# Altium integrated library Samtec 2 mm Pitch Terminal Strips.IntLib: 623 symbols (part 5 of 5) (continued)
## TW-15-09-T-D-236-SM-A-P (continued)
SMT Board Stacker, Vertical, -55 to 105 degC, 2 mm Pitch, 30-Pin, Male, RoHS; Manufacturer: Samtec; PartNumber: TW-15-09-T-D-236-SM-A-P; Pitch: 2 mm; DatasheetVersion: F-214; PackageVersion: CL, 3/1993; PackageReference: TW-15-09-X-D-236-SM-A-P; PackageDescription: High Temp 2mm SMT Board Stacking Terminal Strip ASM; Orientation: Vertical; RoHS: True; Temperature Range: -55 to 105 degC; Mounting Technology: Surface Mount; ComponentLink1Description: Manufacturer URL; ComponentLink1URL: http://www.samtec.com; ComponentLink2Description: Datasheet; ComponentLink2URL: http://d2a072wq521u33.cloudfront.net/catalog_english//TW_SM.PDF; ComponentLink3Description: Package Specification; ComponentLink3URL: http://www.samtec.com/documents/webfiles/cpdf/TW-XX-XX-XXX-X-XXX-SM-XXX-XX-MKT1.pdf
footprint SMTC-TW-15-09-X-D-236-SM-A-P (SMT Board Stacking Terminal Strip ASM, 2x15 Pins, Vertical, 2mm Pitch, Male)
pins: 1, 2, 3, 4, 5, 6, 7, 8, 9, 10, 11, 12, 13, 14, 15, 16, 17, 18, 19, 20, 21, 22, 23, 24, 25, 26, 27, 28, 29, 30

## TW-15-12-F-D-375-175
designator P?
Through-Hole Board Stacker, Vertical, -55 to 125 degC, 2 mm Pitch, 30-Pin, Male, RoHS; Manufacturer: Samtec; PartNumber: TW-15-12-F-D-375-175; Pitch: 2 mm; DatasheetVersion: F-214; PackageVersion: BF, 6/1998; PackageReference: TW-15-12-X-D-375-175; PackageDescription: High Temp 2mm Terminal Strip(Board Stacking); Orientation: Vertical; RoHS: True; Temperature Range: -55 to 125 degC; Mounting Technology: Through-hole; ComponentLink1Description: Manufacturer URL; ComponentLink1URL: http://www.samtec.com; ComponentLink2Description: Datasheet; ComponentLink2URL: http://d2a072wq521u33.cloudfront.net/catalog_english//TW_TH.PDF; ComponentLink3Description: Package Specification; ComponentLink3URL: http://www.samtec.com/documents/webfiles/cpdf/TW-XX-XX-X-X-XXX-XXX-XXX-XX-MKT2.pdf
footprint SMTC-TW-15-12-X-D-375-175 (Terminal Strip, 2x15 Pins, Vertical, 2mm Pitch, Male)
pins: 1, 2, 3, 4, 5, 6, 7, 8, 9, 10, 11, 12, 13, 14, 15, 16, 17, 18, 19, 20, 21, 22, 23, 24, 25, 26, 27, 28, 29, 30

## TW-15-12-L-D-375-175
designator P?
Through-Hole Board Stacker, Vertical, -55 to 125 degC, 2 mm Pitch, 30-Pin, Male, RoHS; Manufacturer: Samtec; PartNumber: TW-15-12-L-D-375-175; Pitch: 2 mm; DatasheetVersion: F-214; PackageVersion: BF, 6/1998; PackageReference: TW-15-12-X-D-375-175; PackageDescription: High Temp 2mm Terminal Strip(Board Stacking); Orientation: Vertical; RoHS: True; Temperature Range: -55 to 125 degC; Mounting Technology: Through-hole; ComponentLink1Description: Manufacturer URL; ComponentLink1URL: http://www.samtec.com; ComponentLink2Description: Datasheet; ComponentLink2URL: http://d2a072wq521u33.cloudfront.net/catalog_english//TW_TH.PDF; ComponentLink3Description: Package Specification; ComponentLink3URL: http://www.samtec.com/documents/webfiles/cpdf/TW-XX-XX-X-X-XXX-XXX-XXX-XX-MKT2.pdf
footprint SMTC-TW-15-12-X-D-375-175 (Terminal Strip, 2x15 Pins, Vertical, 2mm Pitch, Male)
pins: 1, 2, 3, 4, 5, 6, 7, 8, 9, 10, 11, 12, 13, 14, 15, 16, 17, 18, 19, 20, 21, 22, 23, 24, 25, 26, 27, 28, 29, 30

## TW-15-12-T-D-375-175
designator P?
Through-Hole Board Stacker, Vertical, -55 to 105 degC, 2 mm Pitch, 30-Pin, Male, RoHS; Manufacturer: Samtec; PartNumber: TW-15-12-T-D-375-175; Pitch: 2 mm; DatasheetVersion: F-214; PackageVersion: BF, 6/1998; PackageReference: TW-15-12-X-D-375-175; PackageDescription: High Temp 2mm Terminal Strip(Board Stacking); Orientation: Vertical; RoHS: True; Temperature Range: -55 to 105 degC; Mounting Technology: Through-hole; ComponentLink1Description: Manufacturer URL; ComponentLink1URL: http://www.samtec.com; ComponentLink2Description: Datasheet; ComponentLink2URL: http://d2a072wq521u33.cloudfront.net/catalog_english//TW_TH.PDF; ComponentLink3Description: Package Specification; ComponentLink3URL: http://www.samtec.com/documents/webfiles/cpdf/TW-XX-XX-X-X-XXX-XXX-XXX-XX-MKT2.pdf
footprint SMTC-TW-15-12-X-D-375-175 (Terminal Strip, 2x15 Pins, Vertical, 2mm Pitch, Male)
pins: 1, 2, 3, 4, 5, 6, 7, 8, 9, 10, 11, 12, 13, 14, 15, 16, 17, 18, 19, 20, 21, 22, 23, 24, 25, 26, 27, 28, 29, 30

## TW-16-06-F-D-300-SM-A
designator P?
SMT Board Stacker, Vertical, -55 to 125 degC, 2 mm Pitch, 32-Pin, Male, RoHS; Manufacturer: Samtec; PartNumber: TW-16-06-F-D-300-SM-A; Pitch: 2 mm; DatasheetVersion: F-214; PackageVersion: CL, 3/1993; PackageReference: TW-16-06-X-D-300-SM-A; PackageDescription: High Temp 2mm SMT Board Stacking Terminal Strip ASM; Orientation: Vertical; RoHS: True; Temperature Range: -55 to 125 degC; Mounting Technology: Surface Mount; ComponentLink1Description: Manufacturer URL; ComponentLink1URL: http://www.samtec.com; ComponentLink2Description: Datasheet; ComponentLink2URL: http://d2a072wq521u33.cloudfront.net/catalog_english//TW_SM.PDF; ComponentLink3Description: Package Specification; ComponentLink3URL: http://www.samtec.com/documents/webfiles/cpdf/TW-XX-XX-XXX-X-XXX-SM-XXX-XX-MKT1.pdf
footprint SMTC-TW-16-06-X-D-300-SM-A (SMT Board Stacking Terminal Strip ASM, 2x16 Pins, Vertical, 2mm Pitch, Male)
pins: 1, 2, 3, 4, 5, 6, 7, 8, 9, 10, 11, 12, 13, 14, 15, 16, 17, 18, 19, 20, 21, 22, 23, 24, 25, 26, 27, 28, 29, 30, 31, 32

## TW-16-06-L-D-300-SM-A
designator P?
SMT Board Stacker, Vertical, -55 to 125 degC, 2 mm Pitch, 32-Pin, Male, RoHS; Manufacturer: Samtec; PartNumber: TW-16-06-L-D-300-SM-A; Pitch: 2 mm; DatasheetVersion: F-214; PackageVersion: CL, 3/1993; PackageReference: TW-16-06-X-D-300-SM-A; PackageDescription: High Temp 2mm SMT Board Stacking Terminal Strip ASM; Orientation: Vertical; RoHS: True; Temperature Range: -55 to 125 degC; Mounting Technology: Surface Mount; ComponentLink1Description: Manufacturer URL; ComponentLink1URL: http://www.samtec.com; ComponentLink2Description: Datasheet; ComponentLink2URL: http://d2a072wq521u33.cloudfront.net/catalog_english//TW_SM.PDF; ComponentLink3Description: Package Specification; ComponentLink3URL: http://www.samtec.com/documents/webfiles/cpdf/TW-XX-XX-XXX-X-XXX-SM-XXX-XX-MKT1.pdf
footprint SMTC-TW-16-06-X-D-300-SM-A (SMT Board Stacking Terminal Strip ASM, 2x16 Pins, Vertical, 2mm Pitch, Male)
pins: 1, 2, 3, 4, 5, 6, 7, 8, 9, 10, 11, 12, 13, 14, 15, 16, 17, 18, 19, 20, 21, 22, 23, 24, 25, 26, 27, 28, 29, 30, 31, 32

## TW-16-06-T-D-300-SM-A
designator P?
SMT Board Stacker, Vertical, -55 to 105 degC, 2 mm Pitch, 32-Pin, Male, RoHS; Manufacturer: Samtec; PartNumber: TW-16-06-T-D-300-SM-A; Pitch: 2 mm; DatasheetVersion: F-214; PackageVersion: CL, 3/1993; PackageReference: TW-16-06-X-D-300-SM-A; PackageDescription: High Temp 2mm SMT Board Stacking Terminal Strip ASM; Orientation: Vertical; RoHS: True; Temperature Range: -55 to 105 degC; Mounting Technology: Surface Mount; ComponentLink1Description: Manufacturer URL; ComponentLink1URL: http://www.samtec.com; ComponentLink2Description: Datasheet; ComponentLink2URL: http://d2a072wq521u33.cloudfront.net/catalog_english//TW_SM.PDF; ComponentLink3Description: Package Specification; ComponentLink3URL: http://www.samtec.com/documents/webfiles/cpdf/TW-XX-XX-XXX-X-XXX-SM-XXX-XX-MKT1.pdf
footprint SMTC-TW-16-06-X-D-300-SM-A (SMT Board Stacking Terminal Strip ASM, 2x16 Pins, Vertical, 2mm Pitch, Male)
pins: 1, 2, 3, 4, 5, 6, 7, 8, 9, 10, 11, 12, 13, 14, 15, 16, 17, 18, 19, 20, 21, 22, 23, 24, 25, 26, 27, 28, 29, 30, 31, 32

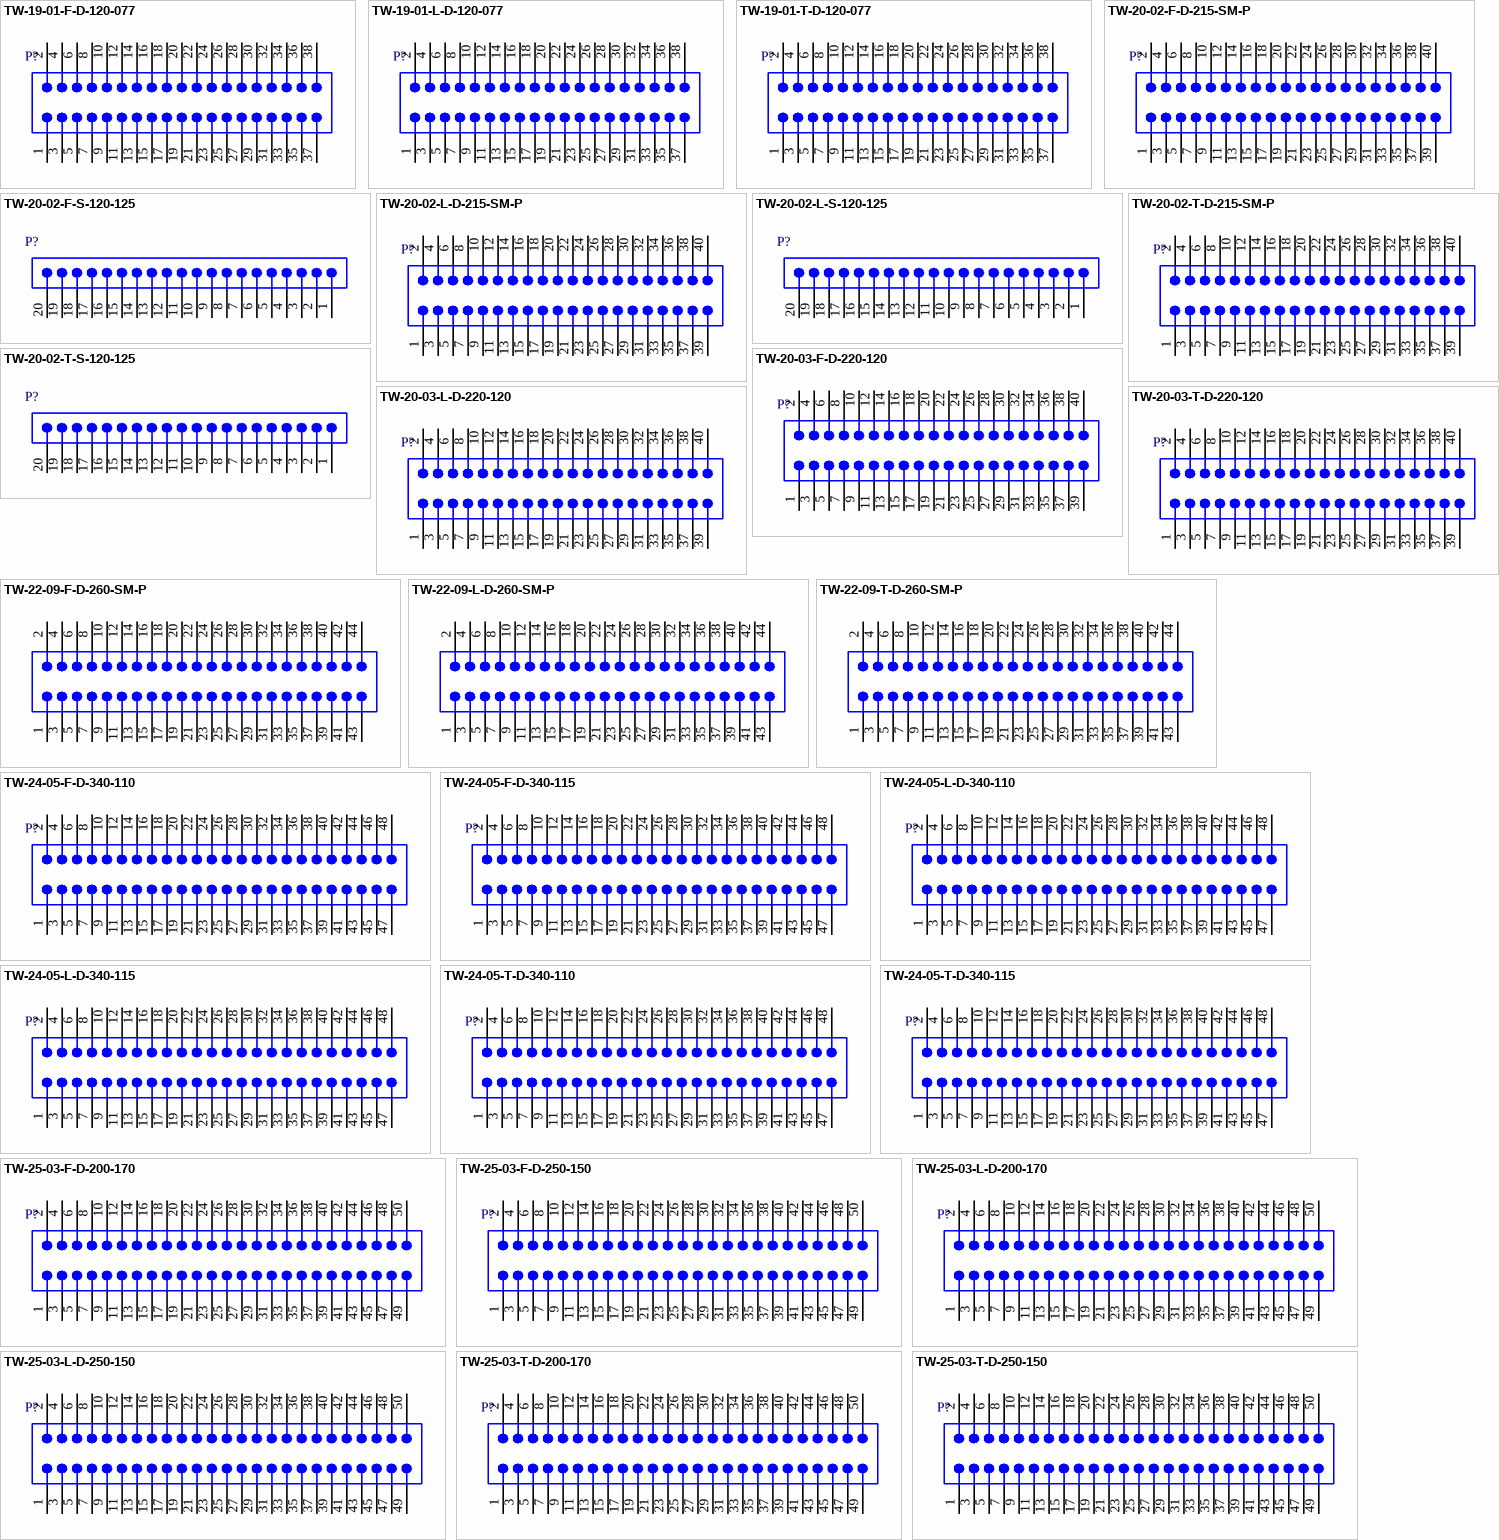
[diagram p15: symbols TW-19-01-F-D-120-077 to TW-25-03-T-D-250-150]

## TW-19-01-F-D-120-077
designator P?
Through-Hole Board Stacker, Vertical, -55 to 125 degC, 2 mm Pitch, 38-Pin, Male, RoHS; Manufacturer: Samtec; PartNumber: TW-19-01-F-D-120-077; Pitch: 2 mm; DatasheetVersion: F-214; PackageVersion: BF, 6/1998; PackageReference: TW-19-01-X-D-120-077; PackageDescription: High Temp 2mm Terminal Strip(Board Stacking); Orientation: Vertical; RoHS: True; Temperature Range: -55 to 125 degC; Mounting Technology: Through-hole; ComponentLink1Description: Manufacturer URL; ComponentLink1URL: http://www.samtec.com; ComponentLink2Description: Datasheet; ComponentLink2URL: http://d2a072wq521u33.cloudfront.net/catalog_english//TW_TH.PDF; ComponentLink3Description: Package Specification; ComponentLink3URL: http://www.samtec.com/documents/webfiles/cpdf/TW-XX-XX-X-X-XXX-XXX-XXX-XX-MKT2.pdf
footprint SMTC-TW-19-01-X-D-120-077 (Terminal Strip, 2x19 Pins, Vertical, 2mm Pitch, Male)
pins: 1, 2, 3, 4, 5, 6, 7, 8, 9, 10, 11, 12, 13, 14, 15, 16, 17, 18, 19, 20, 21, 22, 23, 24, 25, 26, 27, 28, 29, 30, 31, 32, 33, 34, 35, 36, 37, 38

## TW-19-01-L-D-120-077
designator P?
Through-Hole Board Stacker, Vertical, -55 to 125 degC, 2 mm Pitch, 38-Pin, Male, RoHS; Manufacturer: Samtec; PartNumber: TW-19-01-L-D-120-077; Pitch: 2 mm; DatasheetVersion: F-214; PackageVersion: BF, 6/1998; PackageReference: TW-19-01-X-D-120-077; PackageDescription: High Temp 2mm Terminal Strip(Board Stacking); Orientation: Vertical; RoHS: True; Temperature Range: -55 to 125 degC; Mounting Technology: Through-hole; ComponentLink1Description: Manufacturer URL; ComponentLink1URL: http://www.samtec.com; ComponentLink2Description: Datasheet; ComponentLink2URL: http://d2a072wq521u33.cloudfront.net/catalog_english//TW_TH.PDF; ComponentLink3Description: Package Specification; ComponentLink3URL: http://www.samtec.com/documents/webfiles/cpdf/TW-XX-XX-X-X-XXX-XXX-XXX-XX-MKT2.pdf
footprint SMTC-TW-19-01-X-D-120-077 (Terminal Strip, 2x19 Pins, Vertical, 2mm Pitch, Male)
pins: 1, 2, 3, 4, 5, 6, 7, 8, 9, 10, 11, 12, 13, 14, 15, 16, 17, 18, 19, 20, 21, 22, 23, 24, 25, 26, 27, 28, 29, 30, 31, 32, 33, 34, 35, 36, 37, 38

## TW-19-01-T-D-120-077
designator P?
Through-Hole Board Stacker, Vertical, -55 to 105 degC, 2 mm Pitch, 38-Pin, Male, RoHS; Manufacturer: Samtec; PartNumber: TW-19-01-T-D-120-077; Pitch: 2 mm; DatasheetVersion: F-214; PackageVersion: BF, 6/1998; PackageReference: TW-19-01-X-D-120-077; PackageDescription: High Temp 2mm Terminal Strip(Board Stacking); Orientation: Vertical; RoHS: True; Temperature Range: -55 to 105 degC; Mounting Technology: Through-hole; ComponentLink1Description: Manufacturer URL; ComponentLink1URL: http://www.samtec.com; ComponentLink2Description: Datasheet; ComponentLink2URL: http://d2a072wq521u33.cloudfront.net/catalog_english//TW_TH.PDF; ComponentLink3Description: Package Specification; ComponentLink3URL: http://www.samtec.com/documents/webfiles/cpdf/TW-XX-XX-X-X-XXX-XXX-XXX-XX-MKT2.pdf
footprint SMTC-TW-19-01-X-D-120-077 (Terminal Strip, 2x19 Pins, Vertical, 2mm Pitch, Male)
pins: 1, 2, 3, 4, 5, 6, 7, 8, 9, 10, 11, 12, 13, 14, 15, 16, 17, 18, 19, 20, 21, 22, 23, 24, 25, 26, 27, 28, 29, 30, 31, 32, 33, 34, 35, 36, 37, 38

## TW-20-02-F-D-215-SM-P
designator P?
SMT Board Stacker, Vertical, -55 to 125 degC, 2 mm Pitch, 40-Pin, Male, RoHS; Manufacturer: Samtec; PartNumber: TW-20-02-F-D-215-SM-P; Pitch: 2 mm; DatasheetVersion: F-214; PackageVersion: CL, 3/1993; PackageReference: TW-20-02-X-D-215-SM-P; PackageDescription: High Temp 2mm SMT Board Stacking Terminal Strip ASM; Orientation: Vertical; RoHS: True; Temperature Range: -55 to 125 degC; Mounting Technology: Surface Mount; ComponentLink1Description: Manufacturer URL; ComponentLink1URL: http://www.samtec.com; ComponentLink2Description: Datasheet; ComponentLink2URL: http://d2a072wq521u33.cloudfront.net/catalog_english//TW_SM.PDF; ComponentLink3Description: Package Specification; ComponentLink3URL: http://www.samtec.com/documents/webfiles/cpdf/TW-XX-XX-XXX-X-XXX-SM-XXX-XX-MKT1.pdf
footprint SMTC-TW-20-02-X-D-215-SM-P (SMT Board Stacking Terminal Strip ASM, 2x20 Pins, Vertical, 2mm Pitch, Male)
pins: 1, 2, 3, 4, 5, 6, 7, 8, 9, 10, 11, 12, 13, 14, 15, 16, 17, 18, 19, 20, 21, 22, 23, 24, 25, 26, 27, 28, 29, 30, 31, 32, 33, 34, 35, 36, 37, 38, 39, 40

## TW-20-02-F-S-120-125
designator P?
Through-Hole Board Stacker, Vertical, -55 to 125 degC, 2 mm Pitch, 20-Pin, Male, RoHS; Manufacturer: Samtec; PartNumber: TW-20-02-F-S-120-125; Pitch: 2 mm; DatasheetVersion: F-214; PackageVersion: BF, 6/1998; PackageReference: TW-20-02-X-S-120-125; PackageDescription: High Temp 2mm Terminal Strip(Board Stacking); Orientation: Vertical; RoHS: True; Temperature Range: -55 to 125 degC; Mounting Technology: Through-hole; ComponentLink1Description: Manufacturer URL; ComponentLink1URL: http://www.samtec.com; ComponentLink2Description: Datasheet; ComponentLink2URL: http://d2a072wq521u33.cloudfront.net/catalog_english//TW_TH.PDF; ComponentLink3Description: Package Specification; ComponentLink3URL: http://www.samtec.com/documents/webfiles/cpdf/TW-XX-XX-X-X-XXX-XXX-XXX-XX-MKT2.pdf
footprint SMTC-TW-20-02-X-S-120-125 (Terminal Strip, 1x20 Pins, Vertical, 2mm Pitch, Male)
pins: 1, 2, 3, 4, 5, 6, 7, 8, 9, 10, 11, 12, 13, 14, 15, 16, 17, 18, 19, 20

## TW-20-02-L-D-215-SM-P
designator P?
SMT Board Stacker, Vertical, -55 to 125 degC, 2 mm Pitch, 40-Pin, Male, RoHS; Manufacturer: Samtec; PartNumber: TW-20-02-L-D-215-SM-P; Pitch: 2 mm; DatasheetVersion: F-214; PackageVersion: CL, 3/1993; PackageReference: TW-20-02-X-D-215-SM-P; PackageDescription: High Temp 2mm SMT Board Stacking Terminal Strip ASM; Orientation: Vertical; RoHS: True; Temperature Range: -55 to 125 degC; Mounting Technology: Surface Mount; ComponentLink1Description: Manufacturer URL; ComponentLink1URL: http://www.samtec.com; ComponentLink2Description: Datasheet; ComponentLink2URL: http://d2a072wq521u33.cloudfront.net/catalog_english//TW_SM.PDF; ComponentLink3Description: Package Specification; ComponentLink3URL: http://www.samtec.com/documents/webfiles/cpdf/TW-XX-XX-XXX-X-XXX-SM-XXX-XX-MKT1.pdf
footprint SMTC-TW-20-02-X-D-215-SM-P (SMT Board Stacking Terminal Strip ASM, 2x20 Pins, Vertical, 2mm Pitch, Male)
pins: 1, 2, 3, 4, 5, 6, 7, 8, 9, 10, 11, 12, 13, 14, 15, 16, 17, 18, 19, 20, 21, 22, 23, 24, 25, 26, 27, 28, 29, 30, 31, 32, 33, 34, 35, 36, 37, 38, 39, 40

## TW-20-02-L-S-120-125
designator P?
Through-Hole Board Stacker, Vertical, -55 to 125 degC, 2 mm Pitch, 20-Pin, Male, RoHS; Manufacturer: Samtec; PartNumber: TW-20-02-L-S-120-125; Pitch: 2 mm; DatasheetVersion: F-214; PackageVersion: BF, 6/1998; PackageReference: TW-20-02-X-S-120-125; PackageDescription: High Temp 2mm Terminal Strip(Board Stacking); Orientation: Vertical; RoHS: True; Temperature Range: -55 to 125 degC; Mounting Technology: Through-hole; ComponentLink1Description: Manufacturer URL; ComponentLink1URL: http://www.samtec.com; ComponentLink2Description: Datasheet; ComponentLink2URL: http://d2a072wq521u33.cloudfront.net/catalog_english//TW_TH.PDF; ComponentLink3Description: Package Specification; ComponentLink3URL: http://www.samtec.com/documents/webfiles/cpdf/TW-XX-XX-X-X-XXX-XXX-XXX-XX-MKT2.pdf
footprint SMTC-TW-20-02-X-S-120-125 (Terminal Strip, 1x20 Pins, Vertical, 2mm Pitch, Male)
pins: 1, 2, 3, 4, 5, 6, 7, 8, 9, 10, 11, 12, 13, 14, 15, 16, 17, 18, 19, 20

## TW-20-02-T-D-215-SM-P
designator P?
SMT Board Stacker, Vertical, -55 to 105 degC, 2 mm Pitch, 40-Pin, Male, RoHS; Manufacturer: Samtec; PartNumber: TW-20-02-T-D-215-SM-P; Pitch: 2 mm; DatasheetVersion: F-214; PackageVersion: CL, 3/1993; PackageReference: TW-20-02-X-D-215-SM-P; PackageDescription: High Temp 2mm SMT Board Stacking Terminal Strip ASM; Orientation: Vertical; RoHS: True; Temperature Range: -55 to 105 degC; Mounting Technology: Surface Mount; ComponentLink1Description: Manufacturer URL; ComponentLink1URL: http://www.samtec.com; ComponentLink2Description: Datasheet; ComponentLink2URL: http://d2a072wq521u33.cloudfront.net/catalog_english//TW_SM.PDF; ComponentLink3Description: Package Specification; ComponentLink3URL: http://www.samtec.com/documents/webfiles/cpdf/TW-XX-XX-XXX-X-XXX-SM-XXX-XX-MKT1.pdf
footprint SMTC-TW-20-02-X-D-215-SM-P (SMT Board Stacking Terminal Strip ASM, 2x20 Pins, Vertical, 2mm Pitch, Male)
pins: 1, 2, 3, 4, 5, 6, 7, 8, 9, 10, 11, 12, 13, 14, 15, 16, 17, 18, 19, 20, 21, 22, 23, 24, 25, 26, 27, 28, 29, 30, 31, 32, 33, 34, 35, 36, 37, 38, 39, 40

## TW-20-02-T-S-120-125
designator P?
Through-Hole Board Stacker, Vertical, -55 to 105 degC, 2 mm Pitch, 20-Pin, Male, RoHS; Manufacturer: Samtec; PartNumber: TW-20-02-T-S-120-125; Pitch: 2 mm; DatasheetVersion: F-214; PackageVersion: BF, 6/1998; PackageReference: TW-20-02-X-S-120-125; PackageDescription: High Temp 2mm Terminal Strip(Board Stacking); Orientation: Vertical; RoHS: True; Temperature Range: -55 to 105 degC; Mounting Technology: Through-hole; ComponentLink1Description: Manufacturer URL; ComponentLink1URL: http://www.samtec.com; ComponentLink2Description: Datasheet; ComponentLink2URL: http://d2a072wq521u33.cloudfront.net/catalog_english//TW_TH.PDF; ComponentLink3Description: Package Specification; ComponentLink3URL: http://www.samtec.com/documents/webfiles/cpdf/TW-XX-XX-X-X-XXX-XXX-XXX-XX-MKT2.pdf
footprint SMTC-TW-20-02-X-S-120-125 (Terminal Strip, 1x20 Pins, Vertical, 2mm Pitch, Male)
pins: 1, 2, 3, 4, 5, 6, 7, 8, 9, 10, 11, 12, 13, 14, 15, 16, 17, 18, 19, 20

## TW-20-03-F-D-220-120
designator P?
Through-Hole Board Stacker, Vertical, -55 to 125 degC, 2 mm Pitch, 40-Pin, Male, RoHS; Manufacturer: Samtec; PartNumber: TW-20-03-F-D-220-120; Pitch: 2 mm; DatasheetVersion: F-214; PackageVersion: BF, 6/1998; PackageReference: TW-20-03-X-D-220-120; PackageDescription: High Temp 2mm Terminal Strip(Board Stacking); Orientation: Vertical; RoHS: True; Temperature Range: -55 to 125 degC; Mounting Technology: Through-hole; ComponentLink1Description: Manufacturer URL; ComponentLink1URL: http://www.samtec.com; ComponentLink2Description: Datasheet; ComponentLink2URL: http://d2a072wq521u33.cloudfront.net/catalog_english//TW_TH.PDF; ComponentLink3Description: Package Specification; ComponentLink3URL: http://www.samtec.com/documents/webfiles/cpdf/TW-XX-XX-X-X-XXX-XXX-XXX-XX-MKT2.pdf
footprint SMTC-TW-20-03-X-D-220-120 (Terminal Strip, 2x20 Pins, Vertical, 2mm Pitch, Male)
pins: 1, 2, 3, 4, 5, 6, 7, 8, 9, 10, 11, 12, 13, 14, 15, 16, 17, 18, 19, 20, 21, 22, 23, 24, 25, 26, 27, 28, 29, 30, 31, 32, 33, 34, 35, 36, 37, 38, 39, 40

## TW-20-03-L-D-220-120
designator P?
Through-Hole Board Stacker, Vertical, -55 to 125 degC, 2 mm Pitch, 40-Pin, Male, RoHS; Manufacturer: Samtec; PartNumber: TW-20-03-L-D-220-120; Pitch: 2 mm; DatasheetVersion: F-214; PackageVersion: BF, 6/1998; PackageReference: TW-20-03-X-D-220-120; PackageDescription: High Temp 2mm Terminal Strip(Board Stacking); Orientation: Vertical; RoHS: True; Temperature Range: -55 to 125 degC; Mounting Technology: Through-hole; ComponentLink1Description: Manufacturer URL; ComponentLink1URL: http://www.samtec.com; ComponentLink2Description: Datasheet; ComponentLink2URL: http://d2a072wq521u33.cloudfront.net/catalog_english//TW_TH.PDF; ComponentLink3Description: Package Specification; ComponentLink3URL: http://www.samtec.com/documents/webfiles/cpdf/TW-XX-XX-X-X-XXX-XXX-XXX-XX-MKT2.pdf
footprint SMTC-TW-20-03-X-D-220-120 (Terminal Strip, 2x20 Pins, Vertical, 2mm Pitch, Male)
pins: 1, 2, 3, 4, 5, 6, 7, 8, 9, 10, 11, 12, 13, 14, 15, 16, 17, 18, 19, 20, 21, 22, 23, 24, 25, 26, 27, 28, 29, 30, 31, 32, 33, 34, 35, 36, 37, 38, 39, 40

## TW-20-03-T-D-220-120
designator P?
Through-Hole Board Stacker, Vertical, -55 to 105 degC, 2 mm Pitch, 40-Pin, Male, RoHS; Manufacturer: Samtec; PartNumber: TW-20-03-T-D-220-120; Pitch: 2 mm; DatasheetVersion: F-214; PackageVersion: BF, 6/1998; PackageReference: TW-20-03-X-D-220-120; PackageDescription: High Temp 2mm Terminal Strip(Board Stacking); Orientation: Vertical; RoHS: True; Temperature Range: -55 to 105 degC; Mounting Technology: Through-hole; ComponentLink1Description: Manufacturer URL; ComponentLink1URL: http://www.samtec.com; ComponentLink2Description: Datasheet; ComponentLink2URL: http://d2a072wq521u33.cloudfront.net/catalog_english//TW_TH.PDF; ComponentLink3Description: Package Specification; ComponentLink3URL: http://www.samtec.com/documents/webfiles/cpdf/TW-XX-XX-X-X-XXX-XXX-XXX-XX-MKT2.pdf
footprint SMTC-TW-20-03-X-D-220-120 (Terminal Strip, 2x20 Pins, Vertical, 2mm Pitch, Male)
pins: 1, 2, 3, 4, 5, 6, 7, 8, 9, 10, 11, 12, 13, 14, 15, 16, 17, 18, 19, 20, 21, 22, 23, 24, 25, 26, 27, 28, 29, 30, 31, 32, 33, 34, 35, 36, 37, 38, 39, 40

## TW-22-09-F-D-260-SM-P
designator ?
SMT Board Stacker, Vertical, -55 to 125 degC, 2 mm Pitch, 44-Pin, Male, RoHS; Manufacturer: Samtec; PartNumber: TW-22-09-F-D-260-SM-P; Pitch: 2 mm; DatasheetVersion: F-214; PackageVersion: CL, 3/1993; PackageReference: TW-22-09-X-D-260-SM-P; PackageDescription: High Temp 2mm SMT Board Stacking Terminal Strip ASM; Orientation: Vertical; RoHS: True; Temperature Range: -55 to 125 degC; Mounting Technology: Surface Mount; ComponentLink1Description: Manufacturer URL; ComponentLink1URL: http://www.samtec.com; ComponentLink2Description: Datasheet; ComponentLink2URL: http://d2a072wq521u33.cloudfront.net/catalog_english//TW_SM.PDF; ComponentLink3Description: Package Specification; ComponentLink3URL: http://www.samtec.com/documents/webfiles/cpdf/TW-XX-XX-XXX-X-XXX-SM-XXX-XX-MKT1.pdf
footprint SMTC-TW-22-09-X-D-260-SM-P (SMT Board Stacking Terminal Strip ASM, 2x22 Pins, Vertical, 2mm Pitch, Male)
pins: 1, 2, 3, 4, 5, 6, 7, 8, 9, 10, 11, 12, 13, 14, 15, 16, 17, 18, 19, 20, 21, 22, 23, 24, 25, 26, 27, 28, 29, 30, 31, 32, 33, 34, 35, 36, 37, 38, 39, 40, 41, 42, 43, 44

## TW-22-09-L-D-260-SM-P
designator ?
SMT Board Stacker, Vertical, -55 to 125 degC, 2 mm Pitch, 44-Pin, Male, RoHS; Manufacturer: Samtec; PartNumber: TW-22-09-L-D-260-SM-P; Pitch: 2 mm; DatasheetVersion: F-214; PackageVersion: CL, 3/1993; PackageReference: TW-22-09-X-D-260-SM-P; PackageDescription: High Temp 2mm SMT Board Stacking Terminal Strip ASM; Orientation: Vertical; RoHS: True; Temperature Range: -55 to 125 degC; Mounting Technology: Surface Mount; ComponentLink1Description: Manufacturer URL; ComponentLink1URL: http://www.samtec.com; ComponentLink2Description: Datasheet; ComponentLink2URL: http://d2a072wq521u33.cloudfront.net/catalog_english//TW_SM.PDF; ComponentLink3Description: Package Specification; ComponentLink3URL: http://www.samtec.com/documents/webfiles/cpdf/TW-XX-XX-XXX-X-XXX-SM-XXX-XX-MKT1.pdf
footprint SMTC-TW-22-09-X-D-260-SM-P (SMT Board Stacking Terminal Strip ASM, 2x22 Pins, Vertical, 2mm Pitch, Male)
pins: 1, 2, 3, 4, 5, 6, 7, 8, 9, 10, 11, 12, 13, 14, 15, 16, 17, 18, 19, 20, 21, 22, 23, 24, 25, 26, 27, 28, 29, 30, 31, 32, 33, 34, 35, 36, 37, 38, 39, 40, 41, 42, 43, 44

## TW-22-09-T-D-260-SM-P
designator ?
SMT Board Stacker, Vertical, -55 to 105 degC, 2 mm Pitch, 44-Pin, Male, RoHS; Manufacturer: Samtec; PartNumber: TW-22-09-T-D-260-SM-P; Pitch: 2 mm; DatasheetVersion: F-214; PackageVersion: CL, 3/1993; PackageReference: TW-22-09-X-D-260-SM-P; PackageDescription: High Temp 2mm SMT Board Stacking Terminal Strip ASM; Orientation: Vertical; RoHS: True; Temperature Range: -55 to 105 degC; Mounting Technology: Surface Mount; ComponentLink1Description: Manufacturer URL; ComponentLink1URL: http://www.samtec.com; ComponentLink2Description: Datasheet; ComponentLink2URL: http://d2a072wq521u33.cloudfront.net/catalog_english//TW_SM.PDF; ComponentLink3Description: Package Specification; ComponentLink3URL: http://www.samtec.com/documents/webfiles/cpdf/TW-XX-XX-XXX-X-XXX-SM-XXX-XX-MKT1.pdf
footprint SMTC-TW-22-09-X-D-260-SM-P (SMT Board Stacking Terminal Strip ASM, 2x22 Pins, Vertical, 2mm Pitch, Male)
pins: 1, 2, 3, 4, 5, 6, 7, 8, 9, 10, 11, 12, 13, 14, 15, 16, 17, 18, 19, 20, 21, 22, 23, 24, 25, 26, 27, 28, 29, 30, 31, 32, 33, 34, 35, 36, 37, 38, 39, 40, 41, 42, 43, 44

## TW-24-05-F-D-340-110
designator P?
Through-Hole Board Stacker, Vertical, -55 to 125 degC, 2 mm Pitch, 48-Pin, Male, RoHS; Manufacturer: Samtec; PartNumber: TW-24-05-F-D-340-110; Pitch: 2 mm; DatasheetVersion: F-214; PackageVersion: BF, 6/1998; PackageReference: TW-24-05-X-D-340-110; PackageDescription: High Temp 2mm Terminal Strip(Board Stacking); Orientation: Vertical; RoHS: True; Temperature Range: -55 to 125 degC; Mounting Technology: Through-hole; ComponentLink1Description: Manufacturer URL; ComponentLink1URL: http://www.samtec.com; ComponentLink2Description: Datasheet; ComponentLink2URL: http://d2a072wq521u33.cloudfront.net/catalog_english//TW_TH.PDF; ComponentLink3Description: Package Specification; ComponentLink3URL: http://www.samtec.com/documents/webfiles/cpdf/TW-XX-XX-X-X-XXX-XXX-XXX-XX-MKT2.pdf
footprint SMTC-TW-24-05-X-D-340-110 (Terminal Strip, 2x24 Pins, Vertical, 2mm Pitch, Male)
pins: 1, 2, 3, 4, 5, 6, 7, 8, 9, 10, 11, 12, 13, 14, 15, 16, 17, 18, 19, 20, 21, 22, 23, 24, 25, 26, 27, 28, 29, 30, 31, 32, 33, 34, 35, 36, 37, 38, 39, 40, 41, 42, 43, 44, 45, 46, 47, 48

## TW-24-05-F-D-340-115
designator P?
Through-Hole Board Stacker, Vertical, -55 to 125 degC, 2 mm Pitch, 48-Pin, Male, RoHS; Manufacturer: Samtec; PartNumber: TW-24-05-F-D-340-115; Pitch: 2 mm; DatasheetVersion: F-214; PackageVersion: BF, 6/1998; PackageReference: TW-24-05-X-D-340-115; PackageDescription: High Temp 2mm Terminal Strip(Board Stacking); Orientation: Vertical; RoHS: True; Temperature Range: -55 to 125 degC; Mounting Technology: Through-hole; ComponentLink1Description: Manufacturer URL; ComponentLink1URL: http://www.samtec.com; ComponentLink2Description: Datasheet; ComponentLink2URL: http://d2a072wq521u33.cloudfront.net/catalog_english//TW_TH.PDF; ComponentLink3Description: Package Specification; ComponentLink3URL: http://www.samtec.com/documents/webfiles/cpdf/TW-XX-XX-X-X-XXX-XXX-XXX-XX-MKT2.pdf
footprint SMTC-TW-24-05-X-D-340-115 (Terminal Strip, 2x24 Pins, Vertical, 2mm Pitch, Male)
pins: 1, 2, 3, 4, 5, 6, 7, 8, 9, 10, 11, 12, 13, 14, 15, 16, 17, 18, 19, 20, 21, 22, 23, 24, 25, 26, 27, 28, 29, 30, 31, 32, 33, 34, 35, 36, 37, 38, 39, 40, 41, 42, 43, 44, 45, 46, 47, 48
